# Altium footprint library Other.PcbLib: 104 footprints (part 7 of 7)
Each footprint in its own frame and in the unit in brackets; x right, y up, seen from the top. Pads: shape width x height; smd on the part's side, far side on the other; paste and mask are expansions set on the pad; w line width, h text height; cw(c..) or ccw(c..) is an arc to the next point about the centre after c.
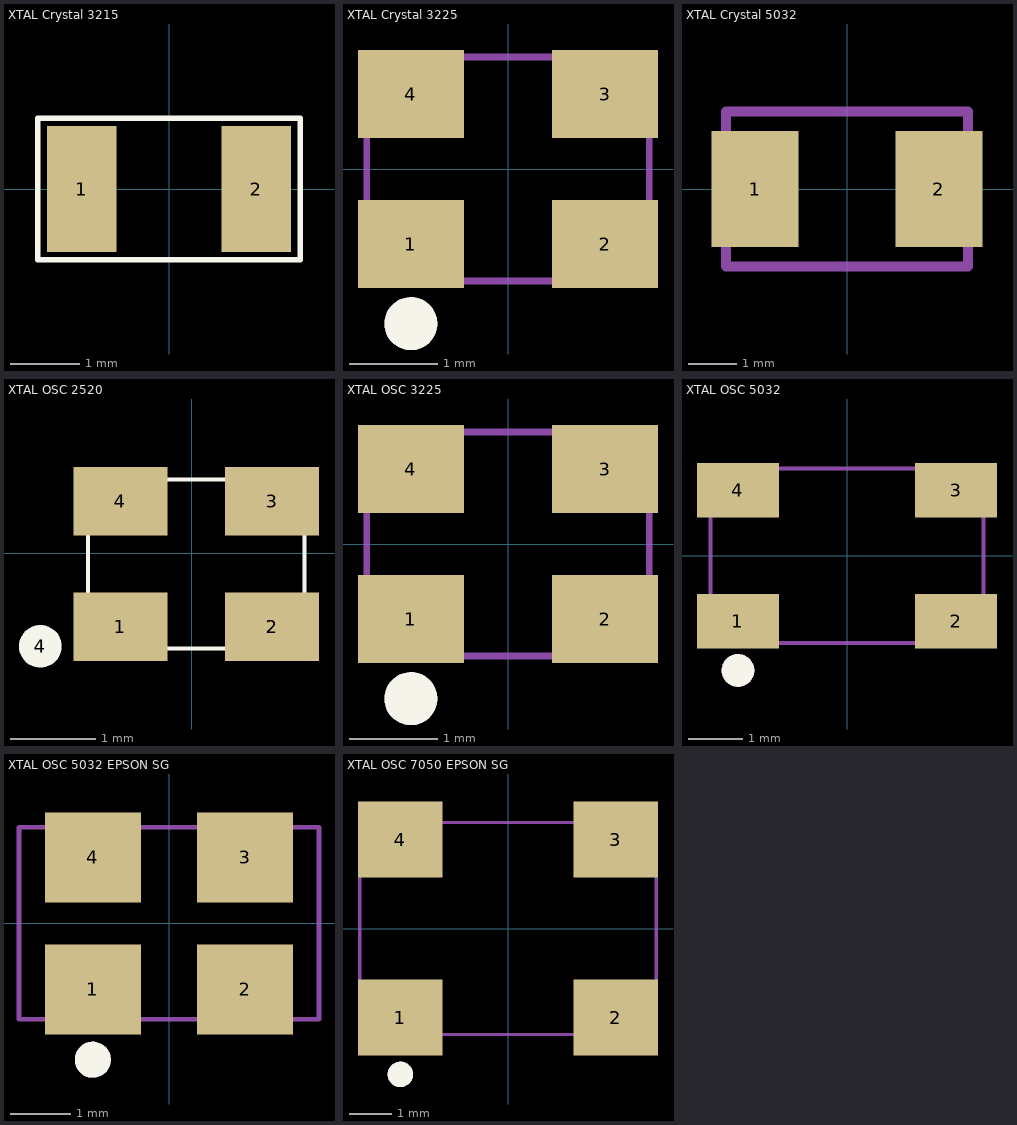
[diagram p6: the footprints below, top view; thin cyan lines are the x and y axes]

## XTAL Crystal 3215 [mm]
pads (2):
  rect 1x1.8 smd: 1(-1.25,0) 2(1.25,0)
Top Overlay:
  lines w0.076: -1.88,-1.016 1.88,-1.016 1.88,1.016 -1.88,1.016 -1.88,-1.016
3D body "XTAL Crystal3215.STEP": height 0.8, standoff 0, extent -1.6,-0.75 1.6,0.75

## XTAL Crystal 3225 [mm]
pads (4):
  rect 1.2x1 smd: 1(-1.1,-0.85) 2(1.1,-0.85) 3(1.1,0.85) 4(-1.1,0.85)
Top Overlay:
  circle w0.3: c-1.1,-1.753 r0.15
Mechanical 15:
  circle w0.3: c-1.1,-1.753 r0.15
  lines w0.076: -1.6,-1.27 1.6,-1.27 1.6,1.27 -1.6,1.27 -1.6,-1.27
3D body "tsx-3225.STEP": height 0.6, standoff 0, extent -1.6,-1.25 1.6,1.25

## XTAL Crystal 5032 [mm]
pads (2):
  rect 1.8x2.4 smd: 1(-1.9,0) 2(1.9,0)
Mechanical 15:
  lines w0.203: -2.5,-1.6 2.5,-1.6 2.5,1.6 -2.5,1.6 ; -2.5,-1.6 -2.5,1.6
3D body "XTAL Crystal 5032.STEP": height 1.5, standoff 0.2, extent -2.5,-1.6 2.5,1.6

## XTAL OSC 2520 [mm]
pads (5):
  rect 1.1x0.8 smd: 1(-0.838,-0.864) 2(0.94,-0.864) 3(0.94,0.61) 4(-0.838,0.61)
  round 0.5 on Top Overlay: 4(-1.778,-1.092)
Top Overlay:
  lines w0.05: -1.219,-1.118 -1.219,0.864 1.321,0.864 1.321,-1.118 -1.219,-1.118
3D body "User Library-SM2520-4.step": height 0.8, standoff -0.03, extent -1.199,-1.127 1.301,0.873

## XTAL OSC 3225 [mm]
pads (4):
  rect 1.2x1 smd: 1(-1.1,-0.85) 2(1.1,-0.85) 3(1.1,0.85) 4(-1.1,0.85)
Top Overlay:
  circle w0.3: c-1.1,-1.753 r0.15
Mechanical 15:
  circle w0.3: c-1.1,-1.753 r0.15
  lines w0.076: -1.6,-1.27 -1.6,1.27 1.6,1.27 1.6,-1.27 -1.6,-1.27
3D body "tsx-3225.STEP": height 0.6, standoff 0, extent -1.6,-1.25 1.6,1.25

## XTAL OSC 5032 [mm]
pads (4):
  rect 1.5x1 smd: 1(-2,-1.2) 2(2,-1.2) 3(2,1.2) 4(-2,1.2)
Top Overlay:
  circle w0.3: c-2,-2.103 r0.15
Mechanical 15:
  circle w0.3: c-2,-2.103 r0.15
  lines w0.076: -2.5,-1.6 2.5,-1.6 2.5,1.6 -2.5,1.6 -2.5,-1.6
3D body "XTAL OSC5032.STEP": height 1, standoff 0, extent -2.5,-1.6 2.5,1.6

## XTAL OSC 5032 EPSON SG [mm]
pads (4):
  rect 1.6x1.5 smd: 1(-1.27,-1.1) 2(1.27,-1.1) 3(1.27,1.1) 4(-1.27,1.1)
Top Overlay:
  circle w0.3: c-1.27,-2.274 r0.15
Mechanical 15:
  circle w0.3: c-1.27,-2.274 r0.15
  lines w0.076: -2.5,-1.6 -2.5,1.6 2.5,1.6 2.5,-1.6 -2.5,-1.6
3D body "XTAL OSC5032.STEP": height 1, standoff 0, extent -2.5,-1.6 2.5,1.6

## XTAL OSC 7050 EPSON SG [mm]
pads (4):
  rect 2x1.8 smd: 1(-2.54,-2.1) 2(2.54,-2.1) 3(2.54,2.1) 4(-2.54,2.1)
Top Overlay:
  circle w0.3: c-2.54,-3.443 r0.15
Mechanical 15:
  circle w0.3: c-2.54,-3.443 r0.15
  lines w0.076: -3.5,-2.5 -3.5,2.5 3.5,2.5 3.5,-2.5 -3.5,-2.5
3D body: height 1, standoff 0, extent -3.5,-2.5 3.5,2.5
3D body: height 1.1, standoff 1, extent -3.404,-2.388 3.404,2.388
3D body: height 1.3, standoff 1.1, extent -3.327,-2.311 3.327,2.311